# Altium footprint library YQPOWER.PcbLib: 215 footprints (part 11 of 14)
Each footprint in its own frame and in the unit in brackets; x right, y up, seen from the top. Pads: shape width x height; smd on the part's side, far side on the other; paste and mask are expansions set on the pad; w line width, h text height; cw(c..) or ccw(c..) is an arc to the next point about the centre after c.
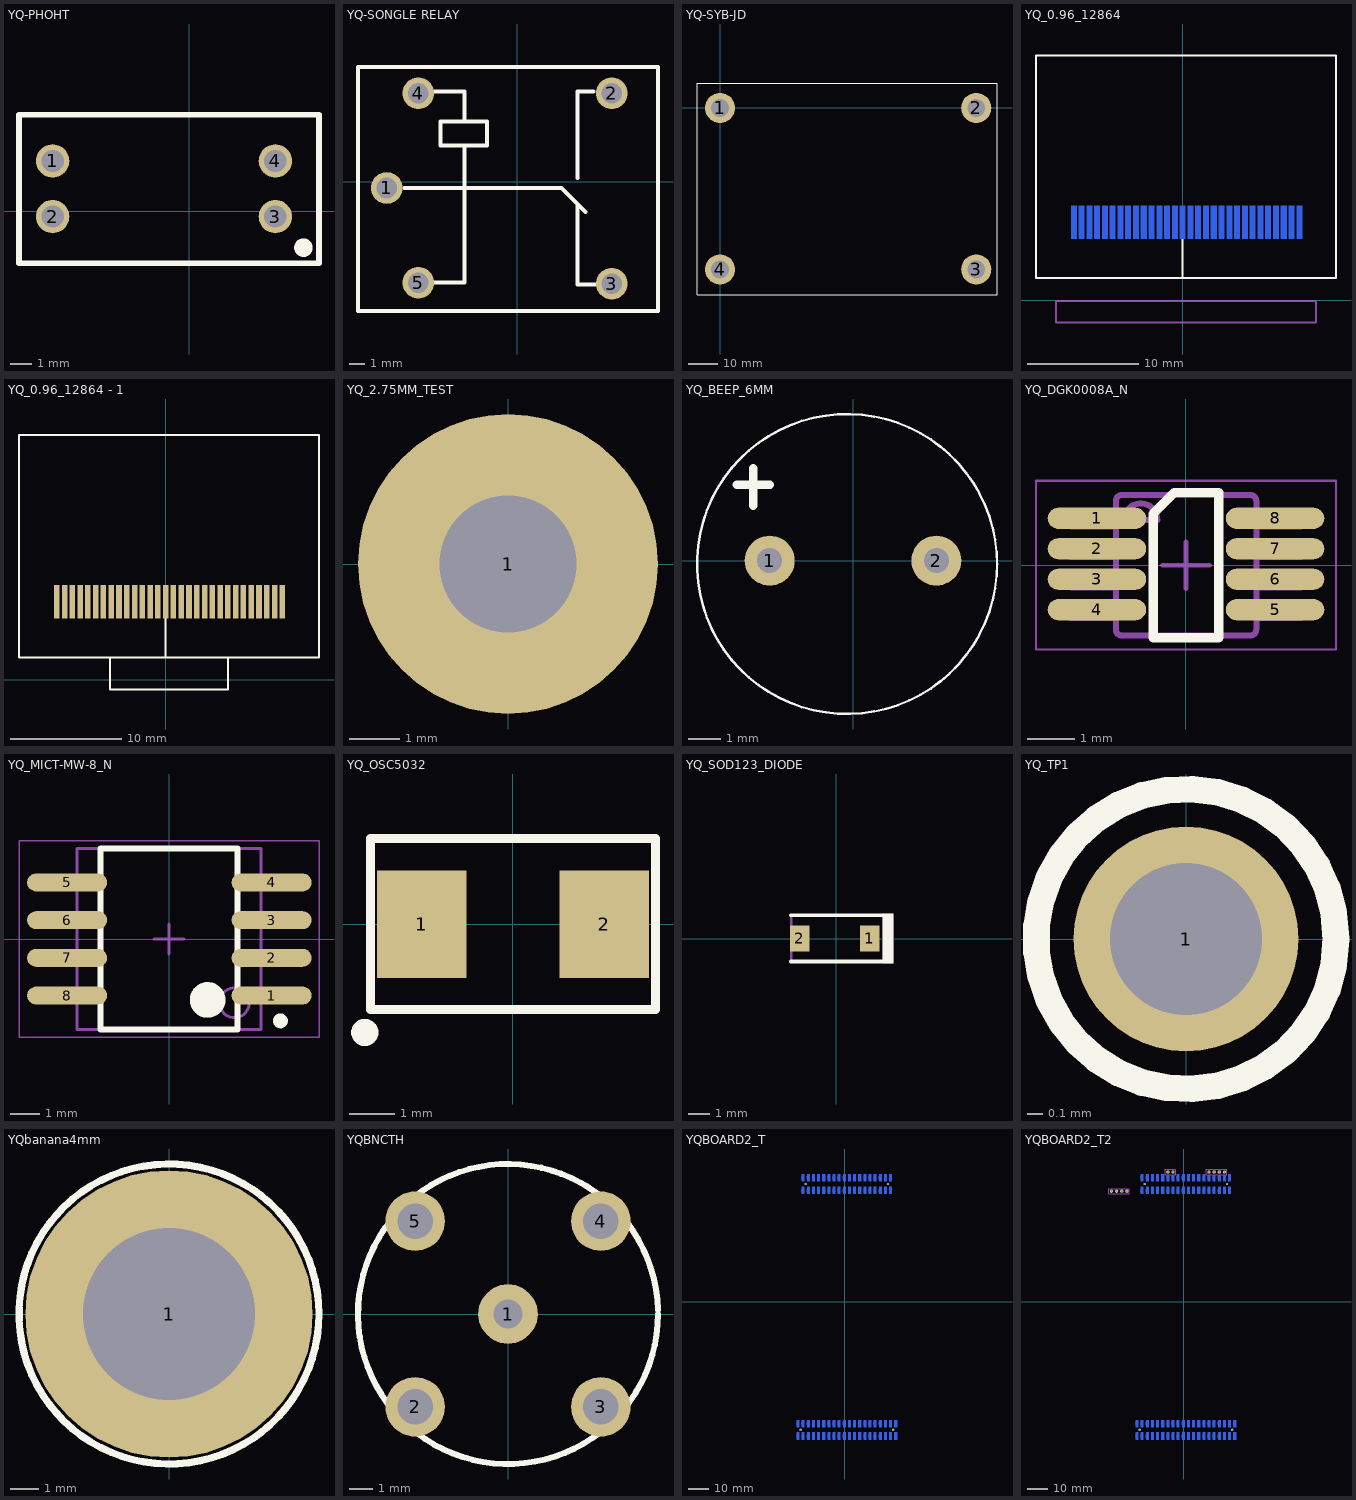
[diagram p10: the footprints below, top view; thin cyan lines are the x and y axes]

## YQ-PHOHT [mil] "光耦"
height 393.7
pads (4):
  round 60 hole 40: 1(-245,90) 2(-245,-10) 3(155,-10) 4(155,90)
Top Overlay:
  circle w19.68: c205.51,-65.75 r6.8
  lines w10: -305.51,-93.7 -305.51,172.83 233.46,172.83 233.46,-93.7 -305.51,-93.7

## YQ-SONGLE RELAY [mm]
pads (5):
  round 2 hole 1.3: 1(-8.223,-0.381) 2(5.977,5.588) 3(5.977,-6.412) 4(-6.223,5.588) 5(-6.223,-6.35)
Top Overlay:
  lines w0.254: -7.112,-0.381 2.794,-0.381 4.318,-1.905 ; -6.604,7.239 8.89,7.239 8.89,-8.128 -10.033,-8.128 -10.033,7.239 -6.35,7.239 ; -5.207,-6.35 -3.302,-6.35 -3.302,2.286 ; -5.207,5.715 -3.302,5.715 -3.302,3.937 ; 3.81,-1.397 3.81,-6.477 4.953,-6.477 ; 3.81,0.254 3.81,5.715 4.826,5.715 ; -4.826,2.286 -4.826,3.81 -1.905,3.81 -1.905,2.286 -4.826,2.286

## YQ-SYB-JD [mil]
pads (4):
  round 400 hole 236: 1(0,0) 2(3395,0) 3(3395,-2140) 4(0,-2140)
Top Overlay:
  lines w12: -305,-2474 3670,-2474 3670,326 -305,326 -305,-2474

## YQ_0.96_12864 [mm]
height 1
pads (30):
  rect 0.5x3 smd far side: 1(-9.8,7) 2(-9.1,7) 3(-8.4,7) 4(-7.7,7) 5(-7,7) 6(-6.3,7) 7(-5.6,7) 8(-4.9,7) 9(-4.2,7) 10(-3.5,7) 11(-2.8,7) 12(-2.1,7) 13(-1.4,7) 14(-0.7,7) 15(0,7) 16(0.7,7) 17(1.4,7) 18(2.1,7) 19(2.8,7) 20(3.5,7) 21(4.2,7) 22(4.9,7) 23(5.6,7) 24(6.3,7) 25(7,7) 26(7.7,7) 27(8.4,7) 28(9.1,7) 29(9.8,7) 30(10.5,7)
Top Overlay:
  lines w0.178: 0,2 0,7 ; -13.2,2 13.8,2 13.8,22 -13.2,22 -13.2,2
Bottom Overlay:
  circle w0.25: c-11,7.4 r0.125
  lines w0.178: 4.9,-1.2 5.6,-1.2 ; 5.6,-1.2 9.3,2.5 11.2,4.4 11.2,9 -10.6,9 -10.6,4.4 -10.5,4.3 -5,-1.2 -4.5,-1.2 0,-1.2 4.5,-1.2 5.6,-1.2
  text "30" at 12.8,8.1 h1.52
  text "1" at -11.4,8.3 h1.52
Mechanical 1:
  lines w0.178: -11.4,-2 12,-2 12,-0.1 -11.4,-0.1 -11.4,-2

## YQ_0.96_12864 - 1 [mm] "焊接正面"
height 1
pads (30):
  rect 0.5x3 smd: 1(-9.8,7) 2(-9.1,7) 3(-8.4,7) 4(-7.7,7) 5(-7,7) 6(-6.3,7) 7(-5.6,7) 8(-4.9,7) 9(-4.2,7) 10(-3.5,7) 11(-2.8,7) 12(-2.1,7) 13(-1.4,7) 14(-0.7,7) 15(0,7) 16(0.7,7) 17(1.4,7) 18(2.1,7) 19(2.8,7) 20(3.5,7) 21(4.2,7) 22(4.9,7) 23(5.6,7) 24(6.3,7) 25(7,7) 26(7.7,7) 27(8.4,7) 28(9.1,7) 29(9.8,7) 30(10.5,7)
Top Overlay:
  lines w0.178: -5,2 -5,-0.9 5.6,-0.9 5.6,2 ; 0,2 0,7 ; -13.2,2 -13.2,22 13.8,22 13.8,2 -13.2,2
Bottom Overlay:
  circle w0.25: c-11,7.4 r0.125
  lines w0.178: 4.9,-1.2 5.6,-1.2 ; 5.6,-1.2 4.5,-1.2 0,-1.2 -4.5,-1.2 -5,-1.2 -10.5,4.3 -10.6,4.4 -10.6,9 11.2,9 11.2,4.4 9.3,2.5 5.6,-1.2
  text "1" at -11.4,8.3 h1.52
  text "30" at 12.8,8.1 h1.52

## YQ_2.75MM_TEST [mm] "测试柱"
pads (1):
  round 6 hole 2.75: 1(0,0)
Top Overlay:
  circle w0.178: c0,0 r1.473
Mechanical 5:
  circle w0.127: c0,0 r1.481
  text ".Designator" at -1.143,-0.254 h0.76
3D body "Keystone_5000.stp": height 4.62, standoff -3, extent -1.245,-1.245 1.246,1.25

## YQ_BEEP_6MM [mil] "6MM"
pads (2):
  round 60 hole 30: 1(-100,0) 2(100,0)
Top Overlay:
  circle w3: c-7.28,-4.05 r180
  lines w10: -139.68,90.95 -99.68,90.95 ; -119.68,65.95 -119.68,110.95

## YQ_DGK0008A_N [mm] "TSOP, 8-Leads, Body 3x3mm, Pitch 0.65mm, IPC Medium Density"
height 1.1
pads (8):
  oval 2.1x0.45 smd mask+0.05: 1(-1.9,1) 2(-1.9,0.35) 3(-1.9,-0.3) 4(-1.9,-0.95) 5(1.9,-0.95) 6(1.9,-0.3) 7(1.9,0.35) 8(1.9,1)
Top Overlay:
  lines w0.2: -0.7,-1.55 0.7,-1.55 0.7,1.55 -0.25,1.55 -0.7,1.1 -0.7,-1.55
Mechanical 5:
  lines w0.127: -2.45,-1.131 -2.21,-1.131 -2.091,-1.131 -2.087,-1.131 -1.784,-1.131 -1.498,-1.131 -1.498,-0.826 -1.784,-0.826 -2.087,-0.826 -2.091,-0.826 -2.21,-0.826 -2.45,-0.826 -2.45,-1.131 ; -2.45,-0.48 -2.21,-0.48 -2.091,-0.48 -2.087,-0.48 -1.784,-0.48 -1.498,-0.48 -1.498,-0.175 -1.784,-0.175 -2.087,-0.175 -2.091,-0.175 -2.21,-0.175 -2.45,-0.175 -2.45,-0.48 ; -2.45,0.17 -2.21,0.17 -2.091,0.17 -2.087,0.17 -1.784,0.17 -1.498,0.17 -1.498,0.475 -1.784,0.475 -2.087,0.475 -2.091,0.475 -2.21,0.475 -2.45,0.475 -2.45,0.17 ; -2.45,0.82 -2.21,0.82 -2.091,0.82 -2.087,0.82 -1.784,0.82 -1.498,0.82 -1.498,1.125 -1.784,1.125 -2.087,1.125 -2.091,1.125 -2.21,1.125 -2.45,1.125 -2.45,0.82 ; -1.497,-1.377 ccw(c-1.37,-1.374) -1.373,-1.501 -1.371,-1.501 1.373,-1.501 1.375,-1.501 ccw(c1.373,-1.374) 1.5,-1.377 1.5,-1.374 1.5,1.369 1.5,1.372 ccw(c1.373,1.369) 1.375,1.496 1.373,1.496 -1.371,1.496 -1.373,1.496 ccw(c-1.37,1.369) -1.497,1.372 -1.498,1.369 -1.498,-1.374 -1.497,-1.377 ; -1.32,0.962 cw(c-0.964,0.962) -0.609,0.962 -1.32,0.962 ; 1.5,-1.131 1.5,-0.826 1.786,-0.826 2.089,-0.826 2.093,-0.826 2.213,-0.826 2.452,-0.826 2.452,-1.131 2.213,-1.131 2.093,-1.131 2.089,-1.131 1.786,-1.131 1.5,-1.131 ; 1.5,-0.48 1.5,-0.175 1.786,-0.175 2.089,-0.175 2.093,-0.175 2.213,-0.175 2.452,-0.175 2.452,-0.48 2.213,-0.48 2.093,-0.48 2.089,-0.48 1.786,-0.48 1.5,-0.48 ; 1.5,0.17 1.5,0.475 1.786,0.475 2.089,0.475 2.093,0.475 2.213,0.475 2.452,0.475 2.452,0.17 2.213,0.17 2.093,0.17 2.089,0.17 1.786,0.17 1.5,0.17 ; 1.5,0.82 1.5,1.125 1.786,1.125 2.089,1.125 2.093,1.125 2.213,1.125 2.452,1.125 2.452,0.82 2.213,0.82 2.093,0.82 2.089,0.82 1.786,0.82 1.5,0.82
  text ".Designator" at -1.15,-0.3 h0.64
Mechanical 15:
  lines w0.05: -3.2,-1.8 -3.2,1.8 3.2,1.8 3.2,-1.8 -3.2,-1.8
  lines w0.1: -0.5,0 0.5,0 ; 0,-0.5 0,0.5
3D body "DGK0008AakaMUA08A.stp": height 0.94, standoff -0.02, extent -2.451,-1.499 2.451,1.498

## YQ_MICT-MW-8_N [mm] "SOIC, 8-Leads, Body 6.2x6.1mm, Pitch 1.27mm, IPC Medium Density"
pads (8):
  oval 2.7x0.6 smd: 1(3.454,-1.905) 2(3.454,-0.635) 3(3.454,0.635) 4(3.454,1.905) 5(-3.429,1.905) 6(-3.429,0.635) 7(-3.429,-0.635) 8(-3.429,-1.905)
Top Overlay:
  circle w0.6: c1.3,-2.05 r0.3
  circle w0.25: c3.75,-2.755 r0.125
  lines w0.2: -2.3,-3.05 2.3,-3.05 2.3,3.05 -2.3,3.05 -2.3,-3.05
Mechanical 13:
  circle w0.1: c2.2,-2.15 r0.5
  lines w0.1: -3.1,-3.05 3.1,-3.05 3.1,3.05 -3.1,3.05 -3.1,-3.05
Mechanical 15:
  lines w0.05: -5.05,-3.3 5.05,-3.3 5.05,3.3 -5.05,3.3 -5.05,-3.3
  lines w0.1: -0.5,0 0.5,0 ; 0,-0.5 0,0.5
3D body: height 0, standoff 0, extent -3.1,-3.05 3.1,3.05

## YQ_OSC5032 [mm]
pads (2):
  rect 2x2.4 smd: 1(-2.032,0) 2(2.032,0)
Top Overlay:
  circle w0.305: c-3.302,-2.413 r0.152
  lines w0.2: -3.175,-1.905 -3.175,1.905 3.175,1.905 3.175,-1.905 -3.175,-1.905

## YQ_SOD123_DIODE [mm]
pads (2):
  rect 0.915x1.22 smd: 1(1.555,0.02) 2(-1.72,0.02)
Top Overlay:
  region: 2.661,1.188 2.153,1.188 2.153,-1.148 2.661,-1.148
  lines w0.178: -2.114,-1.06 2.331,-1.06 ; -2.114,1.099 2.331,1.099
Bottom Overlay:
  lines w0.381: -6.507,-0.01 -1.507,-0.01 ; 1.493,-2.01 1.493,1.99 ; 7.493,-0.01 1.493,-0.01 ; 1.493,-0.01 -1.507,1.99 -1.507,-2.01 1.493,-0.01
Mechanical 5:
  region: 2.661,1.188 2.153,1.188 2.153,-1.148 2.661,-1.148
  lines w0.127: 2.331,-1.06 -2.114,-1.06 -2.114,1.099 2.331,1.099

## YQ_TP1 [mm] "For Keystone 500x miniature loop terminals"
height 4.6
pads (1):
  round 1.5 hole 1.016: 1(0,0)
Top Overlay:
  circle w0.178: c0,0 r1
3D body "Keystone_5000.stp": height 4.62, standoff -3, extent -1.245,-1.245 1.246,1.25

## YQbanana4mm [mm]
pads (1):
  round 10 hole 6: 1(0,0)
Top Overlay:
  circle w0.254: c0,0 r5.221

## YQBNCTH [mm]
pads (5):
  round 2.5 hole 1.2: 1(0,0)
  round 2.5 hole 1.5: 2(-3.9,-3.9) 3(3.9,-3.9) 4(3.9,3.9) 5(-3.9,3.9)
Top Overlay:
  lines w0.254: 6.298,0.165 ccw(c0,0) 6.3,0

## YQBOARD2_T [mil]
pads (80):
  round 39.37 hole 45.28: 0(-855,-2495) 0(-755,2285) 0(845,2285) 0(945,-2495)
  rect 50x140 smd far side: 1(995,-2375) 2(995,-2615) 3(895,-2375) 4(895,-2615) 5(795,-2375) 6(795,-2615) 7(695,-2375) 8(695,-2615) 9(595,-2375) 10(595,-2615) 11(495,-2375) 12(495,-2615) 13(395,-2375) 14(395,-2615) 15(295,-2375) 16(295,-2615) 17(195,-2375) 18(195,-2615) 19(95,-2375) 20(95,-2615) 21(-5,-2375) 22(-5,-2615) 23(-105,-2375) 24(-105,-2615) 25(-205,-2375) 26(-205,-2615) 27(-305,-2375) 28(-305,-2615) 29(-405,-2375) 30(-405,-2615) 31(-505,-2375) 32(-505,-2615) 33(-605,-2375) 34(-605,-2615) 35(-705,-2375) 36(-705,-2615) 37(-805,-2375) 38(-805,-2615) 39(-905,-2375) 40(-905,-2615) 41(895,2405) 42(895,2165) 43(795,2405) 44(795,2165) 45(695,2405) 46(695,2165) 47(595,2405) 48(595,2165) 49(495,2405) 50(495,2165) 51(395,2405) 52(395,2165) 53(295,2405) 54(295,2165) 55(195,2405) 56(195,2165) 57(95,2405) 58(95,2165) 59(-5,2405) 60(-5,2165) 61(-105,2405) 62(-105,2165) 63(-205,2405) 64(-205,2165) 65(-305,2405) 66(-305,2165) 67(-405,2405) 68(-405,2165) 69(-505,2405) 70(-505,2165) 71(-605,2405) 72(-605,2165) 73(-705,2405) 74(-705,2165) 75(-805,2405) 76(-805,2165)
Bottom Overlay:
  region: 1061.5,-2318 1061.5,-2300 1028.5,-2300 1028.5,-2318
  lines w7: -965,-2690 -965,-2300 1065,-2300 1065,-2690 -965,-2690 ; -875,2090 -875,2480 965,2480 965,2090 -875,2090
  lines w10: -1723.31,-2993.66 -1723.31,2516.18 ; -1723.31,2517.16 cw(c-1623.31,2517.16) -1623.31,2617.16 ; -1722.91,-2991.1 ccw(c-1622.91,-2991.1) -1622.91,-3091.1 -1321.06,-3091.1 ; -1627.83,2617.56 1729.45,2617.56 ; -1123.98,-3090.87 -812.16,-3090.87 ; -615.31,-3090.87 -303.5,-3090.87 ; -106.65,-3090.87 205.16,-3090.87 ; 402.01,-3090.87 713.82,-3090.87 ; 910.67,-3090.87 1222.48,-3090.87 ; 1419.33,-3090.87 1719.84,-3090.87 ; 1720,-3090.71 ccw(c1720,-2990.71) 1820,-2990.71 ; 1730.96,2617.03 cw(c1730.96,2527.99) 1820,2527.99 1820,-2991.69
  lines w30: -1783.46,-2760.12 -1783.46,-3154.92 -1557.8,-3154.92 ; -1778.46,2280.12 -1778.46,2674.92 -1552.8,2674.92 ; 1647.8,-3159.92 1873.46,-3159.92 1873.46,-2765.12 ; 1652.8,2674.92 1878.46,2674.92 1878.46,2280.12
  text "1" at 1037,-2342 h40
  text "2" at 1030,-2615 h40
Mechanical 5:
  drawing of 228 lines, arcs and shapes, not listed
  text "1" at 1037,-2342 h40
  text "2" at 1025,-2617 h40

## YQBOARD2_T2 [mil]
pads (90):
  round 39.37 hole 45.28: 0(-855,-2495) 0(-755,2285) 0(845,2285) 0(945,-2495)
  rect 50x140 smd far side: 1(995,-2375) 2(995,-2615) 3(895,-2375) 4(895,-2615) 5(795,-2375) 6(795,-2615) 7(695,-2375) 8(695,-2615) 9(595,-2375) 10(595,-2615) 11(495,-2375) 12(495,-2615) 13(395,-2375) 14(395,-2615) 15(295,-2375) 16(295,-2615) 17(195,-2375) 18(195,-2615) 19(95,-2375) 20(95,-2615) 21(-5,-2375) 22(-5,-2615) 23(-105,-2375) 24(-105,-2615) 25(-205,-2375) 26(-205,-2615) 27(-305,-2375) 28(-305,-2615) 29(-405,-2375) 30(-405,-2615) 31(-505,-2375) 32(-505,-2615) 33(-605,-2375) 34(-605,-2615) 35(-705,-2375) 36(-705,-2615) 37(-805,-2375) 38(-805,-2615) 39(-905,-2375) 40(-905,-2615) 41(895,2405) 42(895,2165) 44(795,2165) 46(695,2165) 48(595,2165) 50(495,2165) 51(395,2405) 52(395,2165) 53(295,2405) 54(295,2165) 55(195,2405) 56(195,2165) 57(95,2405) 58(95,2165) 59(-5,2405) 60(-5,2165) 61(-105,2405) 62(-105,2165) 64(-205,2165) 66(-305,2165) 67(-405,2405) 68(-405,2165) 69(-505,2405) 70(-505,2165) 71(-605,2405) 72(-605,2165) 73(-705,2405) 74(-705,2165) 75(-805,2405) 76(-805,2165)
  rect 50x120 smd far side: 43(795,2395) 45(695,2395) 47(595,2395) 49(495,2395) 63(-205,2395) 65(-305,2395)
  round 64.96 hole 40 mask+0: 77(-1401.85,2147.91) 78(-1301.85,2147.91) 79(-1201.85,2147.91) 80(-1101.85,2147.91) 81(-304.8,2518.82) 82(-204.8,2518.82) 83(494.8,2517.99) 84(594.8,2517.99) 85(694.8,2517.99) 86(794.8,2517.99)
Bottom Overlay:
  region: 1061.5,-2318 1061.5,-2300 1028.5,-2300 1028.5,-2318
  lines w7: -1451.85,2097.91 -1051.85,2097.91 -1051.85,2197.91 -1451.85,2197.91 -1451.85,2097.91 ; -965,-2690 -965,-2300 1065,-2300 1065,-2690 -965,-2690 ; -875,2090 -875,2480 965,2480 965,2090 -875,2090 ; -354.8,2468.82 -354.8,2568.82 -154.8,2568.82 -154.8,2468.82 -354.8,2468.82 ; 444.8,2467.99 844.8,2467.99 844.8,2567.99 444.8,2567.99 444.8,2467.99
  lines w10: -1723.31,-3003.66 -1723.31,2506.18 ; -1723.31,2507.16 cw(c-1623.31,2507.16) -1623.31,2607.16 ; -1722.91,-3001.1 ccw(c-1622.91,-3001.1) -1622.91,-3101.1 -1321.06,-3101.1 ; -1627.83,2607.56 1729.45,2607.56 ; -1123.98,-3100.87 -812.16,-3100.87 ; -615.31,-3100.87 -303.5,-3100.87 ; -106.65,-3100.87 205.16,-3100.87 ; 402.01,-3100.87 713.82,-3100.87 ; 910.67,-3100.87 1222.48,-3100.87 ; 1419.33,-3100.87 1719.84,-3100.87 ; 1720,-3100.71 ccw(c1720,-3000.71) 1820,-3000.71 ; 1730.96,2607.03 cw(c1730.96,2517.99) 1820,2517.99 1820,-3001.69
  lines w30: -1783.46,-2760.12 -1783.46,-3154.92 -1557.8,-3154.92 ; -1778.46,2280.12 -1778.46,2674.92 -1552.8,2674.92 ; 1647.8,-3159.92 1873.46,-3159.92 1873.46,-2765.12 ; 1652.8,2674.92 1878.46,2674.92 1878.46,2280.12
  text "1" at 1037,-2342 h40
  text "2" at 1030,-2615 h40
Mechanical 5:
  drawing of 240 lines, arcs and shapes, not listed
  text "1" at 1037,-2342 h40
  text "2" at 1025,-2617 h40